# Altium footprint library Active.PcbLib: 308 footprints (part 11 of 22)
Each footprint in its own frame and in the unit in brackets; x right, y up, seen from the top. Pads: shape width x height; smd on the part's side, far side on the other; paste and mask are expansions set on the pad; w line width, h text height; cw(c..) or ccw(c..) is an arc to the next point about the centre after c.
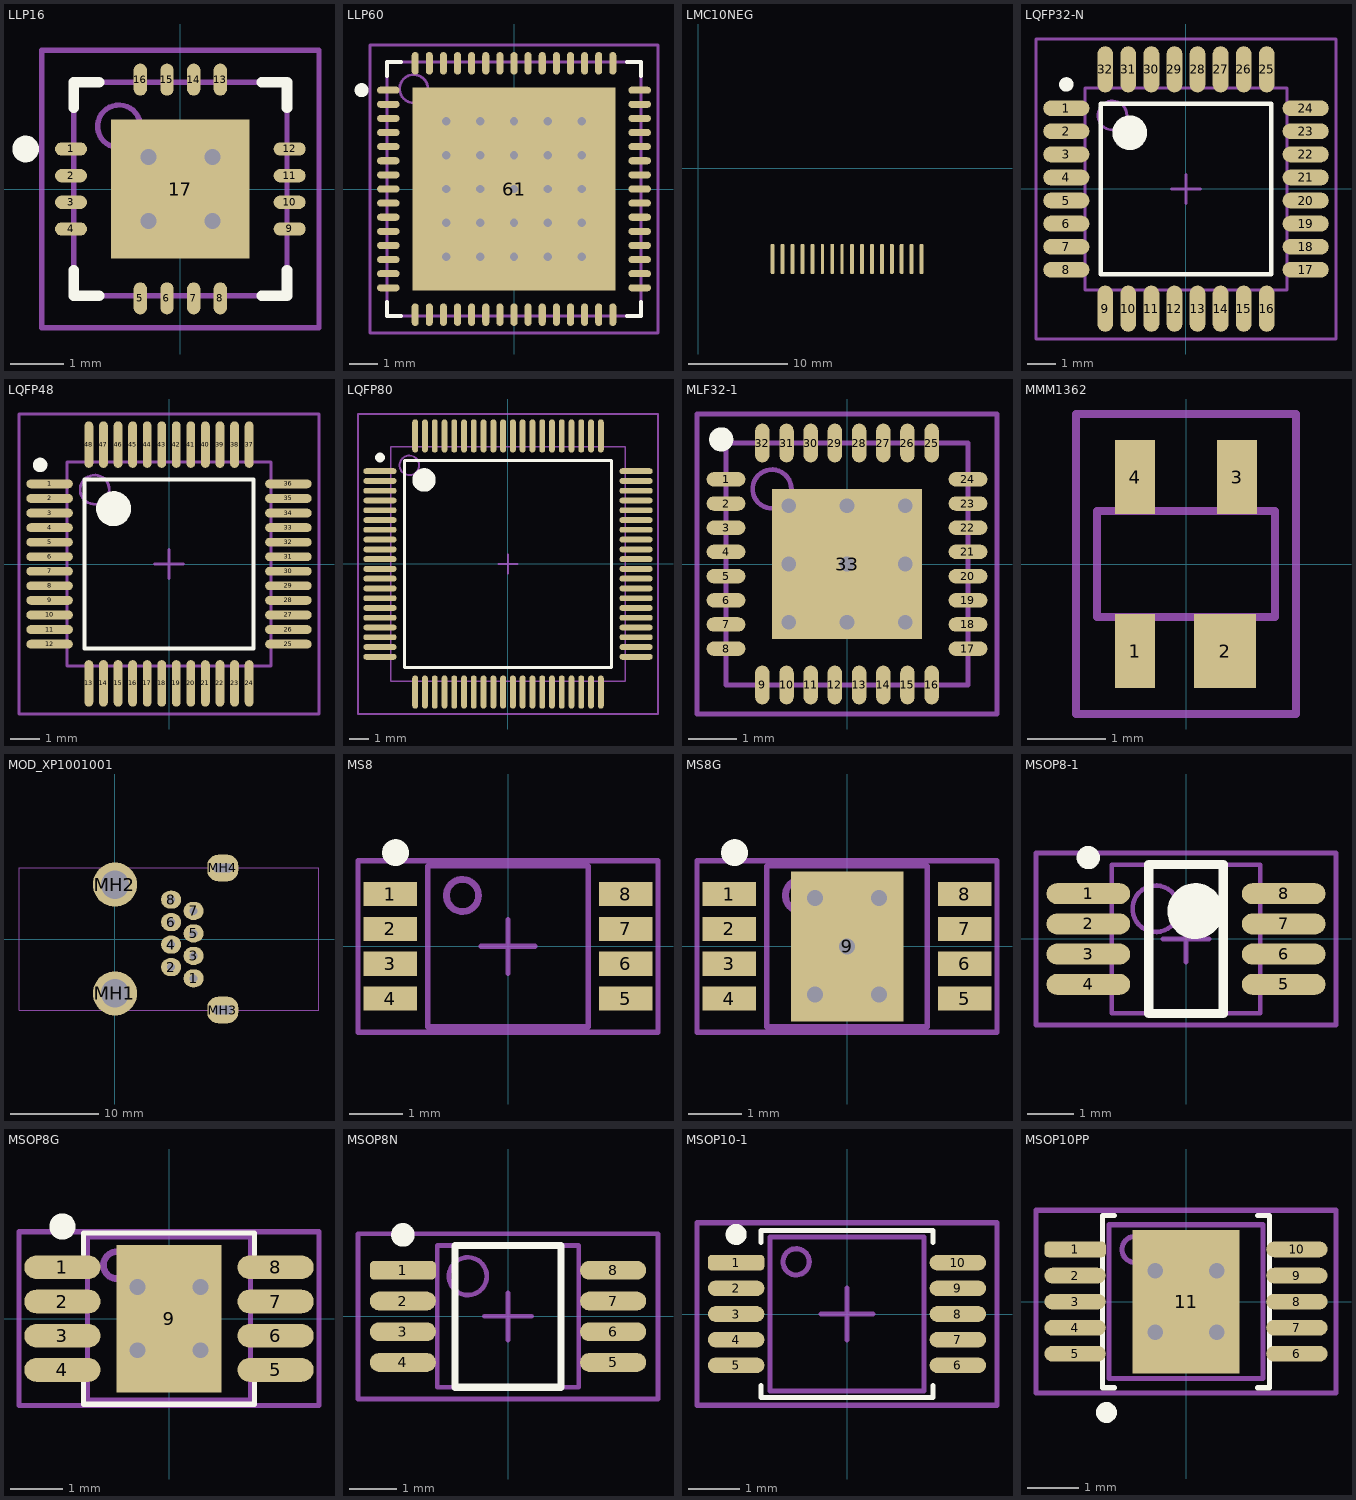
[diagram p10: the footprints below, top view; thin cyan lines are the x and y axes]

## LLP16 [mm] "QFN, 16-Leads, Body 4,0x4,0mm (max), Pitch 0,50mm, IPC Medium Density"
height 0.8
pads (17):
  oval 0.6x0.25 smd mask+0.051: 1(-2.05,0.75) 2(-2.05,0.25) 3(-2.05,-0.25) 4(-2.05,-0.75) 9(2.05,-0.75) 10(2.05,-0.25) 11(2.05,0.25) 12(2.05,0.75)
  oval 0.25x0.6 smd mask+0.051: 5(-0.75,-2.05) 6(-0.25,-2.05) 7(0.25,-2.05) 8(0.75,-2.05) 13(0.75,2.05) 14(0.25,2.05) 15(-0.25,2.05) 16(-0.75,2.05)
  rect 2.6x2.6 smd paste-2 mask-2: 17(0,0)
via 0.6,-0.6 diameter 0.65 hole 0.3
via -0.6,-0.6 diameter 0.65 hole 0.3
via 0.6,0.6 diameter 0.65 hole 0.3
via -0.6,0.6 diameter 0.65 hole 0.3
Top Overlay:
  circle w0.25: c-2.9,0.75 r0.125
  lines w0.2: -2,-1.525 -2,-2 -1.525,-2 ; -2,1.525 -2,2 -1.525,2 ; 1.525,-2 2,-2 2,-1.525 ; 1.525,2 2,2 2,1.525
Top Paste:
  region: 1.3,1.3 1.3,0.75 0.925,0.75 0.75,0.925 0.75,1.3
  region: 1.3,-1.3 0.75,-1.3 0.75,-0.925 0.925,-0.75 1.3,-0.75
  region: -1.3,-1.3 -1.3,-0.75 -0.925,-0.75 -0.75,-0.925 -0.75,-1.3
  region: 0.45,1.3 0.45,0.925 0.275,0.75 -0.275,0.75 -0.45,0.925 -0.45,1.3
  region: 1.3,-0.45 0.925,-0.45 0.75,-0.275 0.75,0.275 0.925,0.45 1.3,0.45
  region: -0.45,-1.3 -0.45,-0.925 -0.275,-0.75 0.275,-0.75 0.45,-0.925 0.45,-1.3
  region: -1.3,1.3 -0.75,1.3 -0.75,0.925 -0.925,0.75 -1.3,0.75
  region: -0.45,0.275 -0.275,0.45 0.275,0.45 0.45,0.275 0.45,-0.275 0.275,-0.45 -0.275,-0.45 -0.45,-0.275
  region: -1.3,0.45 -0.925,0.45 -0.75,0.275 -0.75,-0.275 -0.925,-0.45 -1.3,-0.45
Top Solder:
  region: -1.35,1.35 -0.6,1.35 -0.6,0.931 -0.727,0.906 -0.834,0.834 -0.906,0.727 -0.931,0.6 -0.906,0.473 -0.834,0.366 -0.727,0.294 -0.6,0.269 -0.6,0.275 -0.6,0.269 -0.473,0.294 -0.366,0.366 -0.294,0.473 -0.269,0.6 -0.275,0.6 -0.269,0.6 -0.294,0.727 -0.366,0.834 -0.473,0.906 -0.6,0.931 -0.6,0.925 -0.6,1.35 0,1.35 0,0 -1.35,0
  region: -1.35,-1.35 -1.35,-0.6 -0.931,-0.6 -0.906,-0.727 -0.834,-0.834 -0.727,-0.906 -0.6,-0.931 -0.473,-0.906 -0.366,-0.834 -0.294,-0.727 -0.269,-0.6 -0.275,-0.6 -0.269,-0.6 -0.294,-0.473 -0.366,-0.366 -0.473,-0.294 -0.6,-0.269 -0.6,-0.275 -0.6,-0.269 -0.727,-0.294 -0.834,-0.366 -0.906,-0.473 -0.931,-0.6 -0.925,-0.6 -1.35,-0.6 -1.35,0 0,0 0,-1.35
  region: 1.35,-1.35 0.6,-1.35 0.6,-0.931 0.727,-0.906 0.834,-0.834 0.906,-0.727 0.931,-0.6 0.906,-0.473 0.834,-0.366 0.727,-0.294 0.6,-0.269 0.6,-0.275 0.6,-0.269 0.473,-0.294 0.366,-0.366 0.294,-0.473 0.269,-0.6 0.275,-0.6 0.269,-0.6 0.294,-0.727 0.366,-0.834 0.473,-0.906 0.6,-0.931 0.6,-0.925 0.6,-1.35 0,-1.35 0,0 1.35,0
  region: 1.35,1.35 1.35,0.6 0.931,0.6 0.906,0.727 0.834,0.834 0.727,0.906 0.6,0.931 0.473,0.906 0.366,0.834 0.294,0.727 0.269,0.6 0.275,0.6 0.269,0.6 0.294,0.473 0.366,0.366 0.473,0.294 0.6,0.269 0.6,0.275 0.6,0.269 0.727,0.294 0.834,0.366 0.906,0.473 0.931,0.6 0.925,0.6 1.35,0.6 1.35,0 0,0 0,1.35
Mechanical 13:
  circle w0.1: c-1.15,1.175 r0.4
  lines w0.1: -2,-2 2,-2 2,2 -2,2 -2,-2
Mechanical 15:
  lines w0.1: -0.5,0 0.5,0 ; 0,-0.5 0,0.5 ; -2.6,-2.6 2.6,-2.6 2.6,2.6 -2.6,2.6 -2.6,-2.6
3D body: height 0.81, standoff 0.8, extent -1.55,0.775 -0.753,1.573
3D body: height 0.8, standoff 0.01, extent -2,-2 2,2

## LLP60 [mm] "Leadless 60 pin 9x9x0.8mm R0.5mm"
height 0.8
pads (61):
  oval 0.8x0.25 smd mask+0.025: 1(-4.45,3.5) 2(-4.45,3) 3(-4.45,2.5) 4(-4.45,2) 5(-4.45,1.5) 6(-4.45,1) 7(-4.45,0.5) 8(-4.45,0) 9(-4.45,-0.5) 10(-4.45,-1) 11(-4.45,-1.5) 12(-4.45,-2) 13(-4.45,-2.5) 14(-4.45,-3) 15(-4.45,-3.5) 31(4.45,-3.5) 32(4.45,-3) 33(4.45,-2.5) 34(4.45,-2) 35(4.45,-1.5) 36(4.45,-1) 37(4.45,-0.5) 38(4.45,0) 39(4.45,0.5) 40(4.45,1) 41(4.45,1.5) 42(4.45,2) 43(4.45,2.5) 44(4.45,3) 45(4.45,3.5)
  oval 0.25x0.8 smd mask+0.025: 16(-3.5,-4.45) 17(-3,-4.45) 18(-2.5,-4.45) 19(-2,-4.45) 20(-1.5,-4.45) 21(-1,-4.45) 22(-0.5,-4.45) 23(0,-4.45) 24(0.5,-4.45) 25(1,-4.45) 26(1.5,-4.45) 27(2,-4.45) 28(2.5,-4.45) 29(3,-4.45) 30(3.5,-4.45) 46(3.5,4.45) 47(3,4.45) 48(2.5,4.45) 49(2,4.45) 50(1.5,4.45) 51(1,4.45) 52(0.5,4.45) 53(0,4.45) 54(-0.5,4.45) 55(-1,4.45) 56(-1.5,4.45) 57(-2,4.45) 58(-2.5,4.45) 59(-3,4.45) 60(-3.5,4.45)
  rect 7.2x7.2 smd paste-50 mask-50: 61(0,0)
via -2.4,2.4 diameter 0.65 hole 0.3
via -1.2,2.4 diameter 0.65 hole 0.3
via 0,2.4 diameter 0.65 hole 0.3
via 1.2,2.4 diameter 0.65 hole 0.3
via 2.4,2.4 diameter 0.65 hole 0.3
via -2.4,1.2 diameter 0.65 hole 0.3
via -1.2,1.2 diameter 0.65 hole 0.3
via 0,1.2 diameter 0.65 hole 0.3
via 1.2,1.2 diameter 0.65 hole 0.3
via 2.4,1.2 diameter 0.65 hole 0.3
via -2.4,0 diameter 0.65 hole 0.3
via -1.2,0 diameter 0.65 hole 0.3
via 0,0 diameter 0.65 hole 0.3
via 1.2,0 diameter 0.65 hole 0.3
via 2.4,0 diameter 0.65 hole 0.3
via -2.4,-1.2 diameter 0.65 hole 0.3
via -1.2,-1.2 diameter 0.65 hole 0.3
via 0,-1.2 diameter 0.65 hole 0.3
via 1.2,-1.2 diameter 0.65 hole 0.3
via 2.4,-1.2 diameter 0.65 hole 0.3
via -2.4,-2.4 diameter 0.65 hole 0.3
via -1.2,-2.4 diameter 0.65 hole 0.3
via 0,-2.4 diameter 0.65 hole 0.3
via 1.2,-2.4 diameter 0.65 hole 0.3
via 2.4,-2.4 diameter 0.65 hole 0.3
Top Overlay:
  circle w0.25: c-5.4,3.5 r0.125
  lines w0.15: -4.5,-4 -4.5,-4.5 -4,-4.5 ; -4.5,4 -4.5,4.5 -4,4.5 ; 4,-4.5 4.5,-4.5 4.5,-4 ; 4,4.5 4.5,4.5 4.5,4
Top Paste:
  drawing of 36 lines, arcs and shapes, not listed
Top Solder:
  drawing of 2 lines, arcs and shapes, not listed
Mechanical 12:
  circle w0.4: c2.4,-2.4 r0.15
  circle w0.4: c1.2,-2.4 r0.15
  circle w0.4: c0,-2.4 r0.15
  circle w0.4: c-1.2,-2.4 r0.15
  circle w0.4: c-2.4,-2.4 r0.15
  circle w0.4: c2.4,-1.2 r0.15
  circle w0.4: c1.2,-1.2 r0.15
  circle w0.4: c0,-1.2 r0.15
  circle w0.4: c-1.2,-1.2 r0.15
  circle w0.4: c-2.4,-1.2 r0.15
  circle w0.4: c2.4,0 r0.15
  circle w0.4: c1.2,0 r0.15
  circle w0.4: c0,0 r0.15
  circle w0.4: c-1.2,0 r0.15
  circle w0.4: c-2.4,0 r0.15
  circle w0.4: c2.4,1.2 r0.15
  circle w0.4: c1.2,1.2 r0.15
  circle w0.4: c0,1.2 r0.15
  circle w0.4: c-1.2,1.2 r0.15
  circle w0.4: c-2.4,1.2 r0.15
  circle w0.4: c2.4,2.4 r0.15
  circle w0.4: c1.2,2.4 r0.15
  circle w0.4: c0,2.4 r0.15
  circle w0.4: c-1.2,2.4 r0.15
  circle w0.4: c-2.4,2.4 r0.15
Mechanical 13:
  circle w0.1: c-3.55,3.55 r0.5
  lines w0.1: -4.5,-4.5 -4.5,4.5 4.5,4.5 4.5,-4.5 -4.5,-4.5
Mechanical 15:
  lines w0.1: -0.5,0 0.5,0 ; 0,-0.5 0,0.5 ; -5.1,-5.1 -5.1,5.1 5.1,5.1 5.1,-5.1 -5.1,-5.1
3D body: height 0.81, standoff 0.8, extent -4.06,3.04 -3.04,4.06
3D body: height 0.8, standoff 0.01, extent -4.5,-4.5 4.5,4.5

## LMC10NEG [mm] "10Gb/s PIN Preamp Receiver PT10GC"
height 4
pads (16):
  rrect50% 0.4x3 smd mask-0.051: 1(7.5,-9.15) 2(8.5,-9.15) 3(9.5,-9.15) 4(10.5,-9.15) 5(11.5,-9.15) 7(13.5,-9.15) 9(15.5,-9.15) 10(16.5,-9.15) 11(17.5,-9.15) 12(18.5,-9.15) 13(19.5,-9.15) 14(20.5,-9.15) 15(21.5,-9.15) 16(22.5,-9.15)
  rrect50% 0.3x3 smd mask-0.051: 6(12.5,-9.15) 8(14.5,-9.15)
Top Solder:
  region: 30.1,-6.45 30.1,6.45 -0.125,6.45 -0.125,-6.45
3D body: height 0.2, standoff 0, extent 14.35,-10.125 14.65,-6.625
3D body: height 0.2, standoff 0, extent 12.35,-10.125 12.65,-6.625
3D body: height 0.8, standoff -0.6, extent -71.4,-0.697 -31.4,0.697
3D body: height 1.6, standoff -1.4, extent -31.4,-1.494 -9.4,1.494
3D body: height 0.2, standoff 0, extent 22.3,-10.125 22.7,-6.625
3D body: height 0.2, standoff 0, extent 21.3,-10.125 21.7,-6.625
3D body: height 0.2, standoff 0, extent 20.3,-10.125 20.7,-6.625
3D body: height 0.2, standoff 0, extent 19.3,-10.125 19.7,-6.625
3D body: height 0.2, standoff 0, extent 18.3,-10.125 18.7,-6.625
3D body: height 0.2, standoff 0, extent 17.3,-10.125 17.7,-6.625
3D body: height 0.2, standoff 0, extent 16.3,-10.125 16.7,-6.625
3D body: height 0.2, standoff 0, extent 15.3,-10.125 15.7,-6.625
3D body: height 0.2, standoff 0, extent 13.3,-10.125 13.7,-6.625
3D body: height 0.2, standoff 0, extent 11.3,-10.125 11.7,-6.625
3D body: height 0.2, standoff 0, extent 10.3,-10.125 10.7,-6.625
3D body: height 0.2, standoff 0, extent 9.3,-10.125 9.7,-6.625
3D body: height 0.2, standoff 0, extent 8.3,-10.125 8.7,-6.625
3D body: height 0.2, standoff 0, extent 7.3,-10.125 7.7,-6.625
3D body: height 0, standoff -1.2, extent 6,-7.65 24,-6.35
3D body: height 2.5, standoff -2.3, extent -9.4,-2.391 4.6,2.391
3D body: height 3.1, standoff -5, extent 4.6,-6.35 25,6.35
3D body: height -4, standoff -5, extent 0,-6.35 30,6.35

## LQFP32-N [mm]
height 1.5
pads (32):
  oval 1.6x0.55 smd mask+0.051: 1(-4.15,2.8) 2(-4.15,2) 3(-4.15,1.2) 4(-4.15,0.4) 5(-4.15,-0.4) 6(-4.15,-1.2) 7(-4.15,-2) 8(-4.15,-2.8) 17(4.15,-2.8) 18(4.15,-2) 19(4.15,-1.2) 20(4.15,-0.4) 21(4.15,0.4) 22(4.15,1.2) 23(4.15,2) 24(4.15,2.8)
  oval 0.55x1.6 smd mask+0.051: 9(-2.8,-4.15) 10(-2,-4.15) 11(-1.2,-4.15) 12(-0.4,-4.15) 13(0.4,-4.15) 14(1.2,-4.15) 15(2,-4.15) 16(2.8,-4.15) 25(2.8,4.15) 26(2,4.15) 27(1.2,4.15) 28(0.4,4.15) 29(-0.4,4.15) 30(-1.2,4.15) 31(-2,4.15) 32(-2.8,4.15)
Top Overlay:
  circle w0.6: c-1.95,1.95 r0.3
  circle w0.25: c-4.15,3.625 r0.125
  lines w0.15: -2.95,-2.95 2.95,-2.95 2.95,2.95 -2.95,2.95 -2.95,-2.95
Mechanical 13:
  circle w0.1: c-2.55,2.55 r0.5
  lines w0.1: -3.5,-3.5 3.5,-3.5 3.5,3.5 -3.5,3.5 -3.5,-3.5
Mechanical 15:
  lines w0.1: -0.5,0 0.5,0 ; 0,-0.5 0,0.5 ; -5.2,-5.2 5.2,-5.2 5.2,5.2 -5.2,5.2 -5.2,-5.2
3D body: height 1.5, standoff 0.1, extent -3.5,-3.5 3.5,3.5
3D body: height 1.51, standoff 1.5, extent -3.05,2.05 -2.054,3.048

## LQFP48 [mm] "LQFP, 48-Leads, Body 9,0x9,0mm (max), Pitch 0,50mm, IPC Medium Density"
height 12.6
pads (48):
  oval 1.6x0.3 smd mask+0.051: 1(-4.1,2.75) 2(-4.1,2.25) 3(-4.1,1.75) 4(-4.1,1.25) 5(-4.1,0.75) 6(-4.1,0.25) 7(-4.1,-0.25) 8(-4.1,-0.75) 9(-4.1,-1.25) 10(-4.1,-1.75) 11(-4.1,-2.25) 12(-4.1,-2.75) 25(4.1,-2.75) 26(4.1,-2.25) 27(4.1,-1.75) 28(4.1,-1.25) 29(4.1,-0.75) 30(4.1,-0.25) 31(4.1,0.25) 32(4.1,0.75) 33(4.1,1.25) 34(4.1,1.75) 35(4.1,2.25) 36(4.1,2.75)
  oval 0.3x1.6 smd mask+0.051: 13(-2.75,-4.1) 14(-2.25,-4.1) 15(-1.75,-4.1) 16(-1.25,-4.1) 17(-0.75,-4.1) 18(-0.25,-4.1) 19(0.25,-4.1) 20(0.75,-4.1) 21(1.25,-4.1) 22(1.75,-4.1) 23(2.25,-4.1) 24(2.75,-4.1) 37(2.75,4.1) 38(2.25,4.1) 39(1.75,4.1) 40(1.25,4.1) 41(0.75,4.1) 42(0.25,4.1) 43(-0.25,4.1) 44(-0.75,4.1) 45(-1.25,4.1) 46(-1.75,4.1) 47(-2.25,4.1) 48(-2.75,4.1)
Top Overlay:
  circle w0.25: c-4.425,3.4 r0.125
  circle w0.6: c-1.9,1.9 r0.3
  lines w0.15: -2.9,-2.9 -2.9,2.9 2.9,2.9 2.9,-2.9 -2.9,-2.9
Mechanical 13:
  circle w0.1: c-2.55,2.55 r0.5
  lines w0.1: -3.5,-3.5 -3.5,3.5 3.5,3.5 3.5,-3.5 -3.5,-3.5
Mechanical 15:
  lines w0.1: -0.5,0 0.5,0 ; 0,-0.5 0,0.5 ; -5.15,-5.15 -5.15,5.15 5.15,5.15 5.15,-5.15 -5.15,-5.15
3D body: height 1.6, standoff 0.05, extent -3.5,-3.5 3.5,3.5
3D body: height 1.61, standoff 1.6, extent -3.06,2.04 -2.04,3.06

## LQFP80 [mm] "LQFP, 80-Leads, Body 12x12mm, Pitch 0,50mm, IPC Medium Density"
height 1.6
pads (80):
  oval 1.7x0.3 smd: 1(-6.55,4.75) 2(-6.55,4.25) 3(-6.55,3.75) 4(-6.55,3.25) 5(-6.55,2.75) 6(-6.55,2.25) 7(-6.55,1.75) 8(-6.55,1.25) 9(-6.55,0.75) 10(-6.55,0.25) 11(-6.55,-0.25) 12(-6.55,-0.75) 13(-6.55,-1.25) 14(-6.55,-1.75) 15(-6.55,-2.25) 16(-6.55,-2.75) 17(-6.55,-3.25) 18(-6.55,-3.75) 19(-6.55,-4.25) 20(-6.55,-4.75) 41(6.55,-4.75) 42(6.55,-4.25) 43(6.55,-3.75) 44(6.55,-3.25) 45(6.55,-2.75) 46(6.55,-2.25) 47(6.55,-1.75) 48(6.55,-1.25) 49(6.55,-0.75) 50(6.55,-0.25) 51(6.55,0.25) 52(6.55,0.75) 53(6.55,1.25) 54(6.55,1.75) 55(6.55,2.25) 56(6.55,2.75) 57(6.55,3.25) 58(6.55,3.75) 59(6.55,4.25) 60(6.55,4.75)
  oval 0.3x1.7 smd: 21(-4.75,-6.55) 22(-4.25,-6.55) 23(-3.75,-6.55) 24(-3.25,-6.55) 25(-2.75,-6.55) 26(-2.25,-6.55) 27(-1.75,-6.55) 28(-1.25,-6.55) 29(-0.75,-6.55) 30(-0.25,-6.55) 31(0.25,-6.55) 32(0.75,-6.55) 33(1.25,-6.55) 34(1.75,-6.55) 35(2.25,-6.55) 36(2.75,-6.55) 37(3.25,-6.55) 38(3.75,-6.55) 39(4.25,-6.55) 40(4.75,-6.55) 61(4.75,6.55) 62(4.25,6.55) 63(3.75,6.55) 64(3.25,6.55) 65(2.75,6.55) 66(2.25,6.55) 67(1.75,6.55) 68(1.25,6.55) 69(0.75,6.55) 70(0.25,6.55) 71(-0.25,6.55) 72(-0.75,6.55) 73(-1.25,6.55) 74(-1.75,6.55) 75(-2.25,6.55) 76(-2.75,6.55) 77(-3.25,6.55) 78(-3.75,6.55) 79(-4.25,6.55) 80(-4.75,6.55)
Top Overlay:
  circle w0.25: c-6.55,5.45 r0.125
  circle w0.6: c-4.3,4.3 r0.3
  lines w0.15: -5.3,-5.3 -5.3,5.3 5.3,5.3 5.3,-5.3 -5.3,-5.3
Mechanical 13:
  circle w0.1: c-5.05,5.05 r0.5
  lines w0.1: -6,-6 -6,6 6,6 6,-6 -6,-6
Mechanical 15:
  lines w0.1: -0.5,0 0.5,0 ; 0,-0.5 0,0.5 ; -7.675,-7.675 -7.675,7.675 7.675,7.675 7.675,-7.675 -7.675,-7.675
3D body: height 1.61, standoff 1.6, extent -5.547,4.563 -4.563,5.547
3D body: height 1.6, standoff 0.1, extent -6,-6 6,6

## MLF32-1 [mm] "MLF 32pin W5.0x5.0mm H0.85mm R0.5mm  PP 3.1x3.1mm"
height 0.85
pads (33):
  oval 0.8x0.3 smd mask+0.051: 1(-2.5,1.75) 2(-2.5,1.25) 3(-2.5,0.75) 4(-2.5,0.25) 5(-2.5,-0.25) 6(-2.5,-0.75) 7(-2.5,-1.25) 8(-2.5,-1.75) 17(2.5,-1.75) 18(2.5,-1.25) 19(2.5,-0.75) 20(2.5,-0.25) 21(2.5,0.25) 22(2.5,0.75) 23(2.5,1.25) 24(2.5,1.75)
  oval 0.3x0.8 smd mask+0.051: 9(-1.75,-2.5) 10(-1.25,-2.5) 11(-0.75,-2.5) 12(-0.25,-2.5) 13(0.25,-2.5) 14(0.75,-2.5) 15(1.25,-2.5) 16(1.75,-2.5) 25(1.75,2.5) 26(1.25,2.5) 27(0.75,2.5) 28(0.25,2.5) 29(-0.25,2.5) 30(-0.75,2.5) 31(-1.25,2.5) 32(-1.75,2.5)
  rect 3.1x3.1 smd paste-5 mask-5: 33(0,0)
via -1.2,1.2 diameter 0.65 hole 0.3
via 0,1.2 diameter 0.65 hole 0.3
via 1.2,1.2 diameter 0.65 hole 0.3
via -1.2,0 diameter 0.65 hole 0.3
via 0,0 diameter 0.65 hole 0.3
via 1.2,0 diameter 0.65 hole 0.3
via -1.2,-1.2 diameter 0.65 hole 0.3
via 0,-1.2 diameter 0.65 hole 0.3
via 1.2,-1.2 diameter 0.65 hole 0.3
Top Overlay:
  circle w0.25: c-2.6,2.575 r0.125
Top Paste:
  region: -1.55,1.05 -1.525,1.05 -1.35,0.875 -1.35,0.325 -1.525,0.15 -1.55,0.15
  region: -1.05,0.875 -0.875,1.05 -0.325,1.05 -0.15,0.875 -0.15,0.325 -0.325,0.15 -0.875,0.15 -1.05,0.325
  region: -1.55,-0.15 -1.525,-0.15 -1.35,-0.325 -1.35,-0.875 -1.525,-1.05 -1.55,-1.05
  region: -1.05,-1.55 -1.05,-1.525 -0.875,-1.35 -0.325,-1.35 -0.15,-1.525 -0.15,-1.55
  region: 0.15,-1.55 0.15,-1.525 0.325,-1.35 0.875,-1.35 1.05,-1.525 1.05,-1.55
  region: 1.55,-1.05 1.525,-1.05 1.35,-0.875 1.35,-0.325 1.525,-0.15 1.55,-0.15
  region: 1.55,0.15 1.525,0.15 1.35,0.325 1.35,0.875 1.525,1.05 1.55,1.05
  region: 1.05,1.55 1.05,1.525 0.875,1.35 0.325,1.35 0.15,1.525 0.15,1.55
  region: -0.15,1.55 -0.15,1.525 -0.325,1.35 -0.875,1.35 -1.05,1.525 -1.05,1.55
  region: 0.15,0.875 0.325,1.05 0.875,1.05 1.05,0.875 1.05,0.325 0.875,0.15 0.325,0.15 0.15,0.325
  region: 0.15,-0.325 0.325,-0.15 0.875,-0.15 1.05,-0.325 1.05,-0.875 0.875,-1.05 0.325,-1.05 0.15,-0.875
  region: -1.05,-0.325 -0.875,-0.15 -0.325,-0.15 -0.15,-0.325 -0.15,-0.875 -0.325,-1.05 -0.875,-1.05 -1.05,-0.875
Top Solder:
  drawing of 9 lines, arcs and shapes, not listed
Mechanical 13:
  circle w0.1: c-1.55,1.55 r0.4
  lines w0.1: -2.5,-2.5 -2.5,2.5 2.5,2.5 2.5,-2.5 -2.5,-2.5
Mechanical 15:
  lines w0.1: -0.5,0 0.5,0 ; 0,-0.5 0,0.5 ; -3.1,-3.1 -3.1,3.1 3.1,3.1 3.1,-3.1 -3.1,-3.1
3D body: height 0.85, standoff 0.01, extent -2.5,-2.5 2.5,2.5
3D body: height 0.86, standoff 0.85, extent -1.958,1.142 -1.142,1.958

## MMM1362 [mil]
height 43.31
pads (4):
  rect 20x37 smd: 1(-25.5,-43.5) 3(25.5,43.5) 4(-25.5,43.5)
  rect 31x37 smd: 2(19.5,-43.5)
Mechanical 13:
  lines w4: -44.5,-26.5 44.5,-26.5 44.5,26.5 -44.5,26.5 -44.5,-26.5
Mechanical 15:
  lines w4: -55,-75 -55,75 55,75 55,-75 -55,-75
3D body: height 43, standoff 0, extent -44.5,-26.5 44.5,26.5
3D body: height 44, standoff 43, extent -30,-20 -20.04,-10.02

## MOD_XP1001001 [mil] "Ethernet controller module"
pads (12):
  oval 90x80 hole 35.43: 1(350,-175) 2(250,-125) 3(350,-75) 4(250,-25) 5(350,25) 6(250,75) 7(350,125) 8(250,175)
  round 196.85 hole 125.98: MH1(0,-242) MH2(0,242)
  rrect80% 137.8x118.11 hole 39.37 slot 86.61 at 0 deg: MH3(480,-316) MH4(480,316)
Mechanical 13:
  lines w4: -427,-316 -427,316 908,316 908,-316 -427,-316
3D body: height 644.43, standoff -152.87, extent -425.38,-421.29 956.02,415.33

## MS8 [mm] "MSOP 8pin 3,0x3,0mm R0,65mm High Density NO EP"
height 1.092
pads (8):
  rect 1x0.45 smd mask+0.051: 1(-2.2,0.975) 2(-2.2,0.325) 3(-2.2,-0.325) 4(-2.2,-0.975) 5(2.2,-0.975) 6(2.2,-0.325) 7(2.2,0.325) 8(2.2,0.975)
Top Overlay:
  circle w0.25: c-2.1,1.75 r0.125
Mechanical 13:
  circle w0.127: c-0.85,0.95 r0.3
  lines w0.1: -1.5,-1.5 -1.5,1.5 1.5,1.5 1.5,-1.5 -1.5,-1.5
Mechanical 15:
  lines w0.1: -0.5,0 0.5,0 ; 0,-0.5 0,0.5 ; -2.8,-1.6 -2.8,1.6 2.8,1.6 2.8,-1.6 -2.8,-1.6
3D body: height 1.09, standoff 0.1, extent -1.5,-1.5 1.5,1.5
3D body: height 1.12, standoff 1.09, extent -1.156,0.644 -0.544,1.256

## MS8G [mm] "MSOP 8pin 3,0x3,0mm R0,65mm High Density EP"
height 1.092
pads (9):
  rect 1x0.45 smd mask+0.04: 1(-2.2,0.975) 2(-2.2,0.325) 3(-2.2,-0.325) 4(-2.2,-0.975) 5(2.2,-0.975) 6(2.2,-0.325) 7(2.2,0.325) 8(2.2,0.975)
  rect 2.1x2.8 smd paste-5 mask-5: 9(0,0)
via -0.6,0.9 diameter 0.65 hole 0.3
via 0.6,0.9 diameter 0.65 hole 0.3
via 0.6,-0.9 diameter 0.65 hole 0.3
via -0.6,-0.9 diameter 0.65 hole 0.3
via 0,0 diameter 0.65 hole 0.3
Top Overlay:
  circle w0.25: c-2.1,1.75 r0.125
Top Paste:
  region: -1.05,1.05 -0.925,1.05 -0.75,1.225 -0.75,1.4 -1.05,1.4
  region: 1.05,1.05 0.925,1.05 0.75,1.225 0.75,1.4 1.05,1.4
  region: 1.05,-1.05 0.925,-1.05 0.75,-1.225 0.75,-1.4 1.05,-1.4
  region: -1.05,-1.05 -0.925,-1.05 -0.75,-1.225 -0.75,-1.4 -1.05,-1.4
  region: -0.45,-1.4 -0.45,-1.225 -0.3,-1.075 -0.3,-0.75 -0.15,-0.6 -0.15,-0.325 0.15,-0.325 0.15,-0.6 0.3,-0.725 0.3,-1.075 0.45,-1.225 0.45,-1.4
  region: -0.45,1.4 -0.45,1.225 -0.3,1.075 -0.3,0.75 -0.15,0.6 -0.15,0.325 0.15,0.325 0.15,0.6 0.3,0.725 0.3,1.075 0.45,1.225 0.45,1.4
  region: 1.05,0.575 0.45,0.575 0.325,0.45 0.325,-0.45 0.45,-0.575 1.05,-0.575
  region: -1.05,0.575 -0.45,0.575 -0.325,0.45 -0.325,-0.45 -0.45,-0.575 -1.05,-0.575
Top Solder:
  region: -1.075,-1.425 -0.6,-1.425 -0.6,-1.225 -0.6,-1.231 -0.727,-1.206 -0.834,-1.134 -0.906,-1.027 -0.931,-0.9 -0.906,-0.773 -0.834,-0.666 -0.727,-0.594 -0.6,-0.569 -0.473,-0.594 -0.366,-0.666 -0.294,-0.773 -0.269,-0.9 -0.275,-0.9 -0.269,-0.9 -0.294,-1.027 -0.366,-1.134 -0.473,-1.206 -0.6,-1.231 -0.6,-1.225 -0.6,-1.425 0,-1.425 0,-0.331 -0.127,-0.306 -0.234,-0.234 -0.306,-0.127 -0.331,0 -0.325,0 -1.075,0
  region: 1.075,-1.425 0.6,-1.425 0.6,-1.225 0.6,-1.231 0.727,-1.206 0.834,-1.134 0.906,-1.027 0.931,-0.9 0.906,-0.773 0.834,-0.666 0.727,-0.594 0.6,-0.569 0.473,-0.594 0.366,-0.666 0.294,-0.773 0.269,-0.9 0.275,-0.9 0.269,-0.9 0.294,-1.027 0.366,-1.134 0.473,-1.206 0.6,-1.231 0.6,-1.225 0.6,-1.425 0,-1.425 0,-0.331 0.127,-0.306 0.234,-0.234 0.306,-0.127 0.331,0 0.325,0 1.075,0
  region: 1.075,1.425 0.6,1.425 0.6,1.225 0.6,1.231 0.727,1.206 0.834,1.134 0.906,1.027 0.931,0.9 0.906,0.773 0.834,0.666 0.727,0.594 0.6,0.569 0.473,0.594 0.366,0.666 0.294,0.773 0.269,0.9 0.275,0.9 0.269,0.9 0.294,1.027 0.366,1.134 0.473,1.206 0.6,1.231 0.6,1.225 0.6,1.425 0,1.425 0,0.331 0.127,0.306 0.234,0.234 0.306,0.127 0.331,0 0.325,0 1.075,0
  region: -1.075,1.425 -0.6,1.425 -0.6,1.225 -0.6,1.231 -0.727,1.206 -0.834,1.134 -0.906,1.027 -0.931,0.9 -0.906,0.773 -0.834,0.666 -0.727,0.594 -0.6,0.569 -0.473,0.594 -0.366,0.666 -0.294,0.773 -0.269,0.9 -0.275,0.9 -0.269,0.9 -0.294,1.027 -0.366,1.134 -0.473,1.206 -0.6,1.231 -0.6,1.225 -0.6,1.425 0,1.425 0,0.331 -0.127,0.306 -0.234,0.234 -0.306,0.127 -0.331,0 -0.325,0 -1.075,0
Mechanical 13:
  circle w0.127: c-0.85,0.95 r0.3
  lines w0.1: -1.5,-1.5 -1.5,1.5 1.5,1.5 1.5,-1.5 -1.5,-1.5
Mechanical 15:
  lines w0.1: -0.5,0 0.5,0 ; 0,-0.5 0,0.5 ; -2.8,-1.6 -2.8,1.6 2.8,1.6 2.8,-1.6 -2.8,-1.6
3D body: height 1.09, standoff 0.1, extent -1.5,-1.5 1.5,1.5
3D body: height 1.12, standoff 1.09, extent -1.156,0.644 -0.544,1.256

## MSOP8-1 [mm] "TSOP, 8-Leads, Body 3,2x3,2mm (max), Pitch 0,65mm, IPC Medium Density"
height 1.1
pads (8):
  oval 1.8x0.45 smd mask+0.051: 1(-2.1,0.975) 2(-2.1,0.325) 3(-2.1,-0.325) 4(-2.1,-0.975) 5(2.1,-0.975) 6(2.1,-0.325) 7(2.1,0.325) 8(2.1,0.975)
Top Overlay:
  circle w0.6: c0.2,0.6 r0.3
  circle w0.25: c-2.1,1.75 r0.125
  lines w0.2: -0.8,-1.6 0.8,-1.6 0.8,1.6 -0.8,1.6 -0.8,-1.6
Mechanical 13:
  circle w0.1: c-0.65,0.65 r0.5
  lines w0.1: -1.6,-1.6 1.6,-1.6 1.6,1.6 -1.6,1.6 -1.6,-1.6
Mechanical 15:
  lines w0.1: -0.5,0 0.5,0 ; 0,-0.5 0,0.5 ; -3.225,-1.85 3.225,-1.85 3.225,1.85 -3.225,1.85 -3.225,-1.85
3D body: height 1.11, standoff 1.1, extent -1.35,0.775 -0.952,1.174
3D body: height 1.1, standoff 0.15, extent -1.6,-1.6 1.6,1.6

## MSOP8G [mm] "TSOP, 8-Leads, Body 3,1x3,1mm (max), Pitch 0,65mm, IPC High Density"
height 1.1
pads (9):
  oval 1.45x0.45 smd mask+0.051: 1(-2.025,0.975) 2(-2.025,0.325) 3(-2.025,-0.325) 4(-2.025,-0.975) 5(2.025,-0.975) 6(2.025,-0.325) 7(2.025,0.325) 8(2.025,0.975)
  rect 2x2.8 smd paste-5 mask-5: 9(0,0)
via 0.6,-0.6 diameter 0.65 hole 0.3
via -0.6,-0.6 diameter 0.65 hole 0.3
via 0.6,0.6 diameter 0.65 hole 0.3
via -0.6,0.6 diameter 0.65 hole 0.3
Top Overlay:
  circle w0.25: c-2.025,1.75 r0.125
  lines w0.102: -1.625,-1.225 -1.625,-1.626 1.625,-1.626 1.625,-1.225 ; -1.625,1.225 -1.625,1.626 1.625,1.626 1.625,1.225
Top Paste:
  region: -0.45,0.275 -0.275,0.45 0.275,0.45 0.45,0.275 0.45,-0.275 0.275,-0.45 -0.275,-0.45 -0.45,-0.275
  region: -1,0.45 -0.925,0.45 -0.75,0.275 -0.75,-0.275 -0.925,-0.45 -1,-0.45
  region: -1,1.4 -0.75,1.4 -0.75,0.925 -0.925,0.75 -1,0.75
  region: -0.45,1.4 -0.45,0.925 -0.275,0.75 0.275,0.75 0.45,0.925 0.45,1.4
  region: -1,-1.4 -0.75,-1.4 -0.75,-0.925 -0.925,-0.75 -1,-0.75
  region: 1,-1.4 0.75,-1.4 0.75,-0.925 0.925,-0.75 1,-0.75
  region: 1,1.4 0.75,1.4 0.75,0.925 0.925,0.75 1,0.75
  region: 1,0.45 0.925,0.45 0.75,0.275 0.75,-0.275 0.925,-0.45 1,-0.45
  region: -0.45,-1.4 -0.45,-0.925 -0.275,-0.75 0.275,-0.75 0.45,-0.925 0.45,-1.4
Top Solder:
  region: -1.025,1.425 -0.6,1.425 -0.6,0.931 -0.727,0.906 -0.834,0.834 -0.906,0.727 -0.931,0.6 -0.906,0.473 -0.834,0.366 -0.727,0.294 -0.6,0.269 -0.6,0.275 -0.6,0.269 -0.473,0.294 -0.366,0.366 -0.294,0.473 -0.269,0.6 -0.275,0.6 -0.269,0.6 -0.294,0.727 -0.366,0.834 -0.473,0.906 -0.6,0.931 -0.6,0.925 -0.6,1.425 0,1.425 0.002,0 -0.006,-0.019 -0.025,-0.027 -0.025,-0.025 -1.025,-0.025
  region: -1.025,-1.425 -0.6,-1.425 -0.6,-0.931 -0.727,-0.906 -0.834,-0.834 -0.906,-0.727 -0.931,-0.6 -0.906,-0.473 -0.834,-0.366 -0.727,-0.294 -0.6,-0.269 -0.6,-0.275 -0.6,-0.269 -0.473,-0.294 -0.366,-0.366 -0.294,-0.473 -0.269,-0.6 -0.275,-0.6 -0.269,-0.6 -0.294,-0.727 -0.366,-0.834 -0.473,-0.906 -0.6,-0.931 -0.6,-0.925 -0.6,-1.425 0,-1.425 0.002,0 -0.006,0.019 -0.025,0.027 -0.025,0.025 -1.025,0.025
  region: 1.025,-1.425 0.6,-1.425 0.6,-0.931 0.727,-0.906 0.834,-0.834 0.906,-0.727 0.931,-0.6 0.906,-0.473 0.834,-0.366 0.727,-0.294 0.6,-0.269 0.6,-0.275 0.6,-0.269 0.473,-0.294 0.366,-0.366 0.294,-0.473 0.269,-0.6 0.275,-0.6 0.269,-0.6 0.294,-0.727 0.366,-0.834 0.473,-0.906 0.6,-0.931 0.6,-0.925 0.6,-1.425 0,-1.425 -0.002,0 0.006,0.019 0.025,0.027 0.025,0.025 1.025,0.025
  region: 1.025,1.425 0.6,1.425 0.6,0.931 0.727,0.906 0.834,0.834 0.906,0.727 0.931,0.6 0.906,0.473 0.834,0.366 0.727,0.294 0.6,0.269 0.6,0.275 0.6,0.269 0.473,0.294 0.366,0.366 0.294,0.473 0.269,0.6 0.275,0.6 0.269,0.6 0.294,0.727 0.366,0.834 0.473,0.906 0.6,0.931 0.6,0.925 0.6,1.425 0,1.425 -0.002,0 0.006,-0.019 0.025,-0.027 0.025,-0.025 1.025,-0.025
Mechanical 13:
  circle w0.127: c-0.991,1.016 r0.255
  lines w0.1: -1.55,-1.55 1.55,-1.55 1.55,1.55 -1.55,1.55 -1.55,-1.55
Mechanical 15:
  lines w0.1: -0.5,0 0.5,0 ; 0,-0.5 0,0.5 ; -2.85,-1.65 2.85,-1.65 2.85,1.65 -2.85,1.65 -2.85,-1.65
3D body: height 1.1, standoff 0, extent -1.55,-1.55 1.55,1.55
3D body: height 1.12, standoff 1.1, extent -1.25,0.757 -0.73,1.275

## MSOP8N [mm]
height 1.1
pads (8):
  rrect50% 1.4x0.4 smd: 1(-2.225,0.975)
  oval 1.4x0.4 smd: 2(-2.225,0.325) 3(-2.225,-0.325) 4(-2.225,-0.975) 5(2.225,-0.975) 6(2.225,-0.325) 7(2.225,0.325) 8(2.225,0.975)
Top Overlay:
  circle w0.25: c-2.225,1.725 r0.125
  lines w0.15: -1.125,-1.5 1.125,-1.5 1.125,1.5 -1.125,1.5 -1.125,-1.5
Mechanical 13:
  circle w0.1: c-0.85,0.85 r0.4
  lines w0.1: -1.5,-1.5 1.5,-1.5 1.5,1.5 -1.5,1.5 -1.5,-1.5
Mechanical 15:
  lines w0.1: -0.5,0 0.5,0 ; 0,-0.5 0,0.5 ; -3.175,-1.75 3.175,-1.75 3.175,1.75 -3.175,1.75 -3.175,-1.75
3D body: height 1.1, standoff 0.15, extent -1.5,-1.5 1.5,1.5
3D body: height 1.11, standoff 1.1, extent -1.248,0.452 -0.452,1.25

## MSOP10-1 [mil] "MSOP 10pin 3x3mm R0.5mm"
height 43
pads (10):
  rrect50% 43.31x12 smd mask+1.18: 1(-85,39.37)
  oval 43.31x12 smd mask+1.18: 2(-85,19.68) 3(-85,0) 4(-85,-19.68) 5(-85,-39.37) 6(85,-39.37) 7(85,-19.68) 8(85,0) 9(85,19.68) 10(85,39.37)
Top Overlay:
  circle w8: c-85,61 r4
  lines w4.02: -66,-55 -66,-64 66,-64 66,-55 ; -66,55 -66,64 66,64 66,55
Mechanical 13:
  circle w3.94: c-39,40 r10.05
  lines w4.02: -59,-59 -59,59 59,59 59,-59 -59,-59
Mechanical 15:
  lines w4.02: -20,0 20,0 ; 0,-20 0,20 ; -115,-70 115,-70 115,70 -115,70 -115,-70
3D body: height 43.31, standoff 43, extent -49.34,29.8 -28.95,50.2
3D body: height 43, standoff 3.94, extent -59,-59 59,59

## MSOP10PP [mil] "MSOP 10pin with power pad"
height 43
pads (11):
  rrect50% 47x12 smd mask+2: 1(-85,40)
  oval 47x12 smd mask+2: 2(-85,20) 3(-85,0) 4(-85,-20) 5(-85,-40) 6(85,-40) 7(85,-20) 8(85,0) 9(85,20) 10(85,40)
  rect 82.01x110 smd paste-196.85 mask-196.85: 11(0,0)
via 23.62,23.62 diameter 25.59 hole 11.81
via -23.62,23.62 diameter 25.59 hole 11.81
via 23.62,-23.62 diameter 25.59 hole 11.81
via -23.62,-23.62 diameter 25.59 hole 11.81
Top Overlay:
  circle w8: c-61,-85 r4
  lines w4.02: -55,-66 -64,-66 -64,66 -55,66 ; 55,-66 64,-66 64,66 55,66
Top Paste:
  region: -17.72,-54.13 -17.72,-36.42 -10.83,-29.53 10.83,-29.53 17.72,-36.42 17.72,-54.13
  region: -17.72,54.13 -17.72,36.42 -10.83,29.53 10.83,29.53 17.72,36.42 17.72,54.13
  region: 40.35,17.72 36.42,17.72 29.53,10.83 29.53,-10.83 36.42,-17.72 40.35,-17.72
  region: 40.35,54.13 29.53,54.13 29.53,36.42 36.42,29.53 40.35,29.53
  region: 40.35,-54.13 29.53,-54.13 29.53,-36.42 36.42,-29.53 40.35,-29.53
  region: -40.35,-54.13 -29.53,-54.13 -29.53,-36.42 -36.42,-29.53 -40.35,-29.53
  region: -40.35,54.13 -29.53,54.13 -29.53,36.42 -36.42,29.53 -40.35,29.53
  region: -40.35,17.72 -36.42,17.72 -29.53,10.83 -29.53,-10.83 -36.42,-17.72 -40.35,-17.72
  region: -17.72,10.83 -10.83,17.72 10.83,17.72 17.72,10.83 17.72,-10.83 10.83,-17.72 -10.83,-17.72 -17.72,-10.83
Top Solder:
  region: 42.32,56.1 23.62,56.1 23.62,36.67 28.61,35.67 32.85,32.85 35.67,28.61 36.67,23.62 35.67,18.63 32.85,14.4 28.61,11.57 23.62,10.58 23.62,10.83 23.62,10.58 18.63,11.57 14.4,14.4 11.57,18.63 10.58,23.62 10.83,23.62 10.58,23.62 11.57,28.61 14.4,32.85 18.63,35.67 23.62,36.67 23.62,36.42 23.62,56.1 0,56.1 -0.08,0 0.23,-0.75 0.98,-1.07 0.98,-0.98 42.32,-0.98
  region: 42.32,-56.1 23.62,-56.1 23.62,-36.67 28.61,-35.67 32.85,-32.85 35.67,-28.61 36.67,-23.62 35.67,-18.63 32.85,-14.4 28.61,-11.57 23.62,-10.58 23.62,-10.83 23.62,-10.58 18.63,-11.57 14.4,-14.4 11.57,-18.63 10.58,-23.62 10.83,-23.62 10.58,-23.62 11.57,-28.61 14.4,-32.85 18.63,-35.67 23.62,-36.67 23.62,-36.42 23.62,-56.1 0,-56.1 -0.08,0 0.23,0.75 0.98,1.07 0.98,0.98 42.32,0.98
  region: -42.32,-56.1 -23.62,-56.1 -23.62,-36.67 -28.61,-35.67 -32.85,-32.85 -35.67,-28.61 -36.67,-23.62 -35.67,-18.63 -32.85,-14.4 -28.61,-11.57 -23.62,-10.58 -23.62,-10.83 -23.62,-10.58 -18.63,-11.57 -14.4,-14.4 -11.57,-18.63 -10.58,-23.62 -10.83,-23.62 -10.58,-23.62 -11.57,-28.61 -14.4,-32.85 -18.63,-35.67 -23.62,-36.67 -23.62,-36.42 -23.62,-56.1 0,-56.1 0.08,0 -0.23,0.75 -0.98,1.07 -0.98,0.98 -42.32,0.98
  region: -42.32,56.1 -23.62,56.1 -23.62,36.67 -28.61,35.67 -32.85,32.85 -35.67,28.61 -36.67,23.62 -35.67,18.63 -32.85,14.4 -28.61,11.57 -23.62,10.58 -23.62,10.83 -23.62,10.58 -18.63,11.57 -14.4,14.4 -11.57,18.63 -10.58,23.62 -10.83,23.62 -10.58,23.62 -11.57,28.61 -14.4,32.85 -18.63,35.67 -23.62,36.67 -23.62,36.42 -23.62,56.1 0,56.1 0.08,0 -0.23,-0.75 -0.98,-1.07 -0.98,-0.98 -42.32,-0.98
Mechanical 13:
  circle w3.94: c-39,40 r10.05
  lines w4.02: -59,-59 -59,59 59,59 59,-59 -59,-59
Mechanical 15:
  lines w4.02: -20,0 20,0 ; 0,-20 0,20 ; -115,-70 115,-70 115,70 -115,70 -115,-70
3D body: height 43.31, standoff 43, extent -49.34,29.8 -28.95,50.2
3D body: height 43, standoff 0, extent -59,-59 59,59